# Altium integrated library CONNECTORS - PIN HEADERS.IntLib: 94 symbols (part 1 of 2)
Pins are listed as number, name and electrical type; pins without a type are passive.

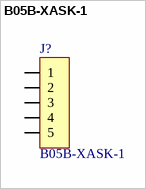
[diagram p0: symbol B05B-XASK-1]

## B05B-XASK-1
designator J?
XA series header, shrouded, Polarizing boss, 2.5mm pitch, 5 pin; Manufacturer: JST (Japan Solderless Terminals); Mates with: XAP-05V-1; Rows: 1; Orientation: Vertical; Pins: 5; Pitch: 2.5mm; PackageDescription: XA Series, 5 pin vertical header with shroud and locking ramp; Part Number: B05B-XASK-1
footprint XA-HDR-5PIN-VERT (XA Series, 5 pin vertical header with shroud and locking ramp)
3D model B05B-XASK-1 (PCB3D Model)
pins: 1, 2, 3, 4, 5


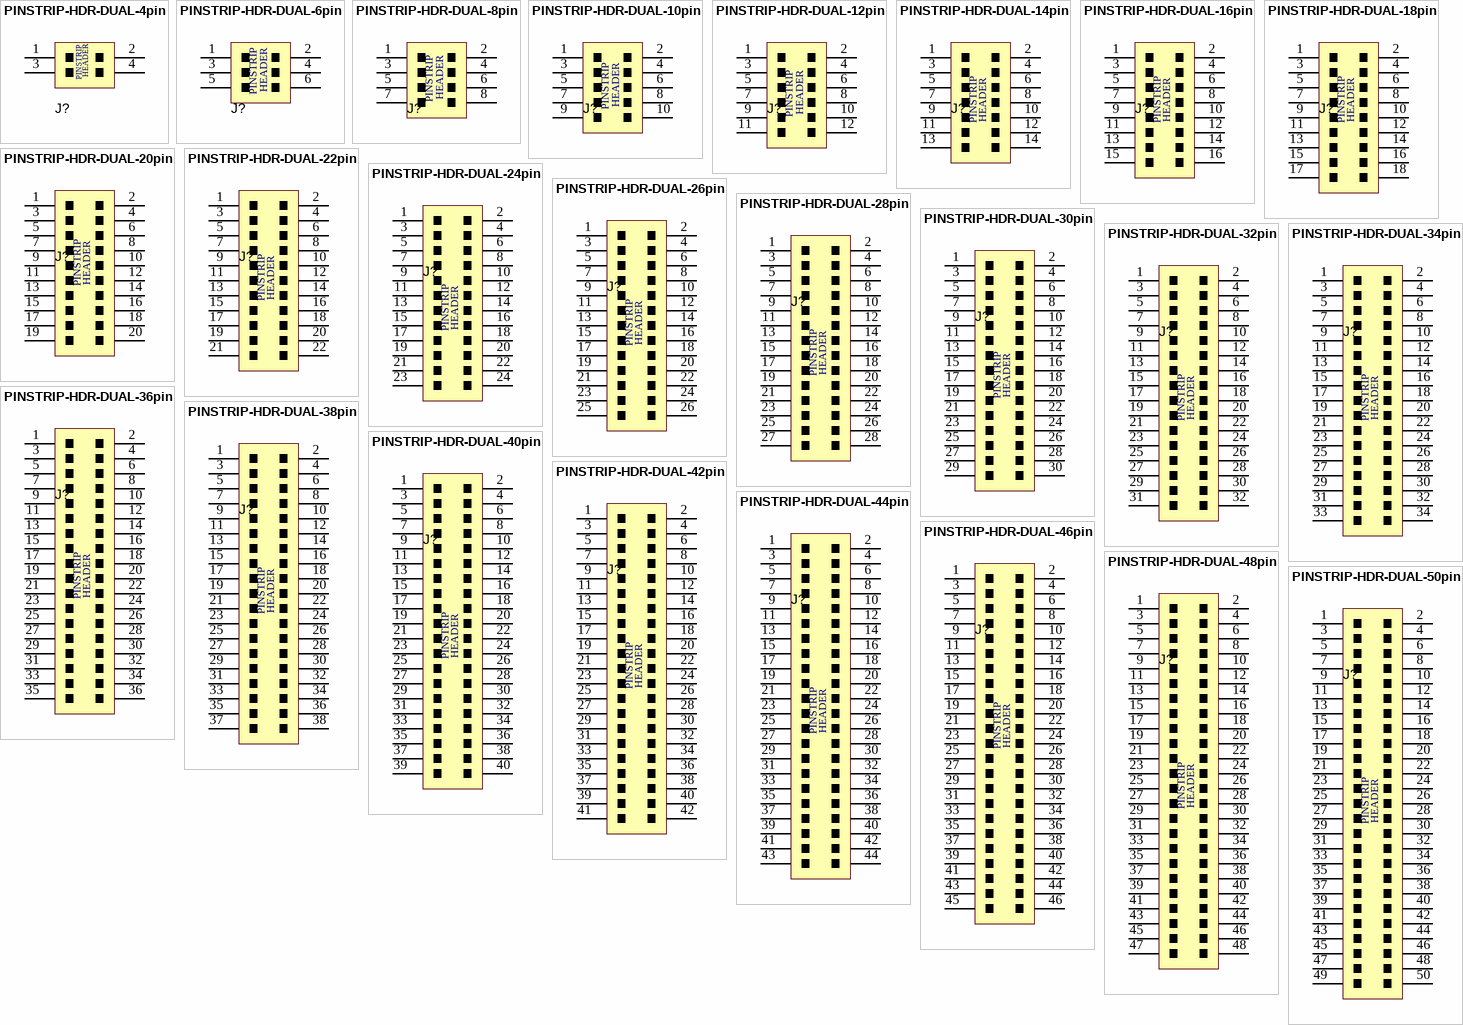
[diagram p1: symbols PINSTRIP-HDR-DUAL-4pin to PINSTRIP-HDR-DUAL-50pin]

## PINSTRIP-HDR-DUAL-4pin
designator J?, comment 9-146261-0  (value not drawn)
4 Pin Header, Pin Strip, , Dual row, 2.54mm pitch, Unshrouded, Pin Strip, Vertical; Manufacturer: TE Connectivity; Part Number: 4/80 of 9-146261-0; Pitch: 0.100" (2.54mm); Rows: 2; Mates With (PCB): 5-534206-2; Mates With (Wire housing): 022-55-2041 (MOLEX, uses crimp series 70058, 70028); Connector Height: 320 mil; Mounting Type: Through Hole; PackageDescription: Pin header; 2.54mm pitch; Pins: 4; Supplier 1: Mouser; Supplier Part Number 1: 571-41037830; Supplier 2: Digi-Key; Supplier Part Number 2: A34268-40-ND; Supplier 3: Mouser; Supplier Part Number 3: 571-9-146261-0
footprint PINSTRIP-DUAL-4PIN-.1 (2.54mm (0.100") pitch, Through Hole, Dual Row, Vertical, 4 pin)
3D model Pinstrip-100mil-DUAL_HDR-4pin (PCB3D Model)
pins: 1, 2, 3, 4
text: PINSTRIP; HEADER

## PINSTRIP-HDR-DUAL-6pin
designator J?, comment 9-146261-0  (value not drawn)
6 Pin Header, Pin Strip, , Dual row, 2.54mm pitch, Unshrouded Pin Strip, Vertical; Manufacturer: TE Connectivity; Part Number: 6/80 of 9-146261-0; Pitch: 0.100" (2.54mm); Rows: 2; Mates With (PCB): 5-534206-3; Mates With (Wire housing): 022-55-2061 (MOLEX, uses crimp series 70058, 70028); Connector Height: 320 mil; Mounting Type: Through Hole; PackageDescription: Pin header; 2.54mm pitch; Pins: 6; Supplier 1: Mouser; Supplier 2: Digi-Key; Supplier 3: Mouser; Supplier Part Number 1: 571-41037830; Supplier Part Number 2: A34268-40-ND; Supplier Part Number 3: 571-9-146261-0
footprint PINSTRIP-DUAL-6PIN-.1 (2.54mm (0.100") Pitch Through Hole, Dual Row, Vertical, 6 pin)
3D model Pinstrip-100mil-DUAL_HDR-6pin (PCB3D Model)
pins: 1, 2, 3, 4, 5, 6
text: PINSTRIP; HEADER

## PINSTRIP-HDR-DUAL-8pin
designator J?, comment 9-146261-0  (value not drawn)
8 Pin Header, Pin Strip, , Dual row, 2.54mm pitch, Unshrouded Pin Strip, Vertical; Manufacturer: TE Connectivity; Part Number: 8/80 of 9-146261-0; Pitch: 0.100" (2.54mm); Rows: 2; Mates With (PCB): 5-534206-4; Mates With (Wire housing): 022-55-2081 (MOLEX, uses crimp series 70058, 70028); Connector Height: 320 mil; Mounting Type: Through Hole; PackageDescription: Pin header; 2.54mm pitch; Pins: 8; Supplier 1: Mouser; Supplier 2: Digi-Key; Supplier 3: Mouser; Supplier Part Number 1: 571-41037830; Supplier Part Number 2: A34268-40-ND; Supplier Part Number 3: 571-9-146261-0
footprint PINSTRIP-DUAL-8PIN-.1 (2.54mm (0.100") Pitch, Through Hole, Dual Row, Vertical, 8 pin)
3D model Pinstrip-100mil-DUAL_HDR-8pin (PCB3D Model)
pins: 1, 2, 3, 4, 5, 6, 7, 8
text: PINSTRIP; HEADER

## PINSTRIP-HDR-DUAL-10pin
designator J?, comment 9-146261-0  (value not drawn)
10 Pin Header, Pin Strip, , Dual row, 2.54mm pitch, Unshrouded Pin Strip, Vertical; Manufacturer: TE Connectivity; Part Number: 10/80 of 9-146261-0; Pitch: 0.100" (2.54mm); Rows: 2; Mates With (PCB): 5-534206-5; Mates With (Wire housing): 022-55-2101 (MOLEX, uses crimp series 70058, 70028); Connector Height: 320 mil; Mounting Type: Through Hole; PackageDescription: Pin header; 2.54mm pitch; Pins: 10; Supplier 1: Mouser; Supplier 2: Digi-Key; Supplier 3: Mouser; Supplier Part Number 1: 571-41037830; Supplier Part Number 2: A34268-40-ND; Supplier Part Number 3: 571-9-146261-0
footprint PINSTRIP-DUAL-10PIN-.1 (2.54mm (0.100") Pitch, Through Hole, Dual Row, Vertical, 10 pin)
3D model Pinstrip-100mil-DUAL_HDR-10pin (PCB3D Model)
pins: 1, 2, 3, 4, 5, 6, 7, 8, 9, 10
text: PINSTRIP; HEADER

## PINSTRIP-HDR-DUAL-12pin
designator J?, comment 9-146261-0  (value not drawn)
12 Pin Header, Pin Strip, , Dual row, 2.54mm pitch, Unshrouded Pin Strip, Vertical; Manufacturer: TE Connectivity; Part Number: 12/80 of 9-146261-0; Pitch: 0.100" (2.54mm); Rows: 2; Mates With (PCB): 5-534206-6; Mates With (Wire housing): 022-55-2121 (MOLEX, uses crimp series 70058, 70028); Connector Height: 320 mil; Mounting Type: Through Hole; PackageDescription: Pin header; 2.54mm pitch; Pins: 12; Supplier 1: Mouser; Supplier 2: Digi-Key; Supplier 3: Mouser; Supplier Part Number 1: 571-41037830; Supplier Part Number 2: A34268-40-ND; Supplier Part Number 3: 571-9-146261-0
footprint PINSTRIP-DUAL-12PIN-.1 (2.54mm (0.100") Pitch, Through Hole, Dual Row, Vertical, 12 pin)
3D model Pinstrip-100mil-DUAL_HDR-12pin (PCB3D Model)
pins: 1, 2, 3, 4, 5, 6, 7, 8, 9, 10, 11, 12
text: PINSTRIP; HEADER

## PINSTRIP-HDR-DUAL-14pin
designator J?, comment 9-146261-0  (value not drawn)
14 Pin Header, Pin Strip, , Dual row, 2.54mm pitch, Unshrouded Pin Strip, Vertical; Manufacturer: TE Connectivity; Part Number: 14/80 of 9-146261-0; Pitch: 0.100" (2.54mm); Rows: 2; Mates With (PCB): 5-534206-7; Mates With (Wire housing): 022-55-2141 (MOLEX, uses crimp series 70058, 70028); Connector Height: 320 mil; Mounting Type: Through Hole; PackageDescription: Pin header; 2.54mm pitch; Pins: 14; Supplier 1: Mouser; Supplier 2: Digi-Key; Supplier 3: Mouser; Supplier Part Number 1: 571-41037830; Supplier Part Number 2: A34268-40-ND; Supplier Part Number 3: 571-9-146261-0
footprint PINSTRIP-DUAL-14PIN-.1 (2.54mm (0.100") Pitch, Through Hole, Dual Row, Vertical, 14 pin)
3D model Pinstrip-100mil-DUAL_HDR-14pin (PCB3D Model)
pins: 1, 2, 3, 4, 5, 6, 7, 8, 9, 10, 11, 12, 13, 14
text: PINSTRIP; HEADER

## PINSTRIP-HDR-DUAL-16pin
designator J?, comment 9-146261-0  (value not drawn)
16 Pin Header, Pin Strip, , Dual row, 2.54mm pitch, Unshrouded Pin Strip, Vertical; Manufacturer: TE Connectivity; Part Number: 16/80 of 9-146261-0; Pitch: 0.100" (2.54mm); Rows: 2; Mates With (PCB): 5-534206-8; Mates With (Wire housing): 022-55-2161 (MOLEX, uses crimp series 70058, 70028); Connector Height: 320 mil; Mounting Type: Through Hole; PackageDescription: Pin header; 2.54mm pitch; Pins: 16; Supplier 1: Mouser; Supplier 2: Digi-Key; Supplier 3: Mouser; Supplier Part Number 1: 571-41037830; Supplier Part Number 2: A34268-40-ND; Supplier Part Number 3: 571-9-146261-0
footprint PINSTRIP-DUAL-16PIN-.1 (2.54mm (0.100") Pitch, Through Hole, Dual Row, Vertical, 16 pin)
3D model Pinstrip-100mil-DUAL_HDR-16pin (PCB3D Model)
pins: 1, 2, 3, 4, 5, 6, 7, 8, 9, 10, 11, 12, 13, 14, 15, 16
text: PINSTRIP; HEADER

## PINSTRIP-HDR-DUAL-18pin
designator J?, comment 9-146261-0  (value not drawn)
18 Pin Header, Pin Strip, , Dual row, 2.54mm pitch, Unshrouded Pin Strip, Vertical; Manufacturer: TE Connectivity; Part Number: 18/80 of 9-146261-0; Pitch: 0.100" (2.54mm); Rows: 2; Mates With (PCB): 5-534206-9; Mates With (Wire housing): 022-55-2181 (MOLEX, uses crimp series 70058, 70028); Connector Height: 320 mil; Mounting Type: Through Hole; PackageDescription: Pin header; 2.54mm pitch; Pins: 18; Supplier 1: Mouser; Supplier 2: Digi-Key; Supplier 3: Mouser; Supplier Part Number 1: 571-41037830; Supplier Part Number 2: A34268-40-ND; Supplier Part Number 3: 571-9-146261-0
footprint PINSTRIP-DUAL-18PIN-.1 (2.54mm (0.100") Pitch, Through Hole, Dual Row, Vertical, 18 pin)
3D model Pinstrip-100mil-DUAL_HDR-18pin (PCB3D Model)
pins: 1, 2, 3, 4, 5, 6, 7, 8, 9, 10, 11, 12, 13, 14, 15, 16, 17, 18
text: PINSTRIP; HEADER

## PINSTRIP-HDR-DUAL-20pin
designator J?, comment 9-146261-0  (value not drawn)
20 Pin Header, Pin Strip, , Dual row, 2.54mm pitch, Unshrouded Pin Strip, Vertical; Manufacturer: TE Connectivity; Part Number: 20/80 of 9-146261-0; Pitch: 0.100" (2.54mm); Rows: 2; Mates With (PCB): 6-534206-0; Mates With (Wire housing): 022-55-2201 (MOLEX, uses crimp series 70058, 70028); Connector Height: 320 mil; Mounting Type: Through Hole; PackageDescription: Pin header; 2.54mm pitch; Pins: 20; Supplier 1: Mouser; Supplier 2: Digi-Key; Supplier 3: Mouser; Supplier Part Number 1: 571-41037830; Supplier Part Number 2: A34268-40-ND; Supplier Part Number 3: 571-9-146261-0
footprint PINSTRIP-DUAL-20PIN-.1 (2.54mm (0.100") Pitch, Through Hole, Dual Row, Vertical, 20 pin)
3D model Pinstrip-100mil-DUAL_HDR-20pin (PCB3D Model)
pins: 1, 2, 3, 4, 5, 6, 7, 8, 9, 10, 11, 12, 13, 14, 15, 16, 17, 18, 19, 20
text: PINSTRIP; HEADER

## PINSTRIP-HDR-DUAL-22pin
designator J?, comment 9-146261-0  (value not drawn)
22 Pin Header, Pin Strip, , Dual row, 2.54mm pitch, Unshrouded Pin Strip, Vertical; Manufacturer: TE Connectivity; Part Number: 22/80 of 9-146261-0; Pitch: 0.100" (2.54mm); Rows: 2; Mates With (PCB): 6-534206-1; Mates With (Wire housing): 022-55-2221 (MOLEX, uses crimp series 70058, 70028); Connector Height: 320 mil; Mounting Type: Through Hole; PackageDescription: Pin header; 2.54mm pitch; Pins: 22; Supplier 1: Mouser; Supplier 2: Digi-Key; Supplier 3: Mouser; Supplier Part Number 1: 571-41037830; Supplier Part Number 2: A34268-40-ND; Supplier Part Number 3: 571-9-146261-0
footprint PINSTRIP-DUAL-22PIN-.1 (2.54mm (0.100") Pitch, Through Hole, Dual Row, Vertical, 22 pin)
3D model Pinstrip-100mil-DUAL_HDR-22pin (PCB3D Model)
pins: 1, 2, 3, 4, 5, 6, 7, 8, 9, 10, 11, 12, 13, 14, 15, 16, 17, 18, 19, 20, 21, 22
text: PINSTRIP; HEADER

## PINSTRIP-HDR-DUAL-24pin
designator J?, comment 9-146261-0  (value not drawn)
24 Pin Header, Pin Strip, , Dual row, 2.54mm pitch, Unshrouded Pin Strip, Vertical; Manufacturer: TE Connectivity; Part Number: 24/80 of 9-146261-0; Pitch: 0.100" (2.54mm); Rows: 2; Mates With (PCB): 6-534206-2; Mates With (Wire housing): 022-55-2241 (MOLEX, uses crimp series 70058, 70028); Connector Height: 320 mil; Mounting Type: Through Hole; PackageDescription: Pin header; 2.54mm pitch; Pins: 24; Supplier 1: Mouser; Supplier 2: Digi-Key; Supplier 3: Mouser; Supplier Part Number 1: 571-41037830; Supplier Part Number 2: A34268-40-ND; Supplier Part Number 3: 571-9-146261-0
footprint PINSTRIP-DUAL-24PIN-.1 (2.54mm (0.100") Pitch, Through Hole, Dual Row, Vertical, 24 pin)
3D model Pinstrip-100mil-DUAL_HDR-24pin (PCB3D Model)
pins: 1, 2, 3, 4, 5, 6, 7, 8, 9, 10, 11, 12, 13, 14, 15, 16, 17, 18, 19, 20, 21, 22, 23, 24
text: PINSTRIP; HEADER

## PINSTRIP-HDR-DUAL-26pin
designator J?, comment 9-146261-0  (value not drawn)
26 Pin Header, Pin Strip, , Dual row, 2.54mm pitch, Unshrouded Pin Strip, Vertical; Manufacturer: TE Connectivity; Part Number: 26/80 of 9-146261-0; Pitch: 0.100" (2.54mm); Rows: 2; Mates With (PCB): 6-534206-3; Mates With (Wire housing): 022-55-2261 (MOLEX, uses crimp series 70058, 70028); Connector Height: 320 mil; Mounting Type: Through Hole; PackageDescription: Pin header; 2.54mm pitch; Pins: 26; Supplier 1: Mouser; Supplier 2: Digi-Key; Supplier 3: Mouser; Supplier Part Number 1: 571-41037830; Supplier Part Number 2: A34268-40-ND; Supplier Part Number 3: 571-9-146261-0
footprint PINSTRIP-DUAL-26PIN-.1 (2.54mm (0.100") Pitch, Through Hole, Dual Row, Vertical, 26 pin)
3D model Pinstrip-100mil-DUAL_HDR-26pin (PCB3D Model)
pins: 1, 2, 3, 4, 5, 6, 7, 8, 9, 10, 11, 12, 13, 14, 15, 16, 17, 18, 19, 20, 21, 22, 23, 24, 25, 26
text: PINSTRIP; HEADER

## PINSTRIP-HDR-DUAL-28pin
designator J?, comment 9-146261-0  (value not drawn)
28 Pin Header, Pin Strip, , Dual row, 2.54mm pitch, Unshrouded Pin Strip, Vertical; Manufacturer: TE Connectivity; Part Number: 28/80 of 9-146261-0; Pitch: 0.100" (2.54mm); Rows: 2; Mates With (PCB): 6-534206-4; Mates With (Wire housing): 022-55-2281 (MOLEX, uses crimp series 70058, 70028); Connector Height: 320 mil; Mounting Type: Through Hole; PackageDescription: Pin header; 2.54mm pitch; Pins: 28; Supplier 1: Mouser; Supplier 2: Digi-Key; Supplier 3: Mouser; Supplier Part Number 1: 571-41037830; Supplier Part Number 2: A34268-40-ND; Supplier Part Number 3: 571-9-146261-0
footprint PINSTRIP-DUAL-28PIN-.1 (2.54mm (0.100") Pitch, Through Hole, Dual Row, Vertical, 28 pin)
3D model Pinstrip-100mil-DUAL_HDR-28pin (PCB3D Model)
pins: 1, 2, 3, 4, 5, 6, 7, 8, 9, 10, 11, 12, 13, 14, 15, 16, 17, 18, 19, 20, 21, 22, 23, 24, 25, 26, 27, 28
text: PINSTRIP; HEADER

## PINSTRIP-HDR-DUAL-30pin
designator J?, comment 9-146261-0  (value not drawn)
30 Pin Header, Pin Strip, , Dual row, 2.54mm pitch, Unshrouded Pin Strip, Vertical; Manufacturer: TE Connectivity; Part Number: 30/80 of 9-146261-0; Pitch: 0.100" (2.54mm); Rows: 2; Mates With (PCB): 6-534206-5; Mates With (Wire housing): 022-55-2301 (MOLEX, uses crimp series 70058, 70028); Connector Height: 320 mil; Mounting Type: Through Hole; PackageDescription: Pin header; 2.54mm pitch; Pins: 30; Supplier 1: Mouser; Supplier 2: Digi-Key; Supplier 3: Mouser; Supplier Part Number 1: 571-41037830; Supplier Part Number 2: A34268-40-ND; Supplier Part Number 3: 571-9-146261-0
footprint PINSTRIP-DUAL-30PIN-.1 (2.54mm (0.100") Pitch, Through Hole, Dual Row, Vertical, 30 pin)
3D model Pinstrip-100mil-DUAL_HDR-30pin (PCB3D Model)
pins: 1, 2, 3, 4, 5, 6, 7, 8, 9, 10, 11, 12, 13, 14, 15, 16, 17, 18, 19, 20, 21, 22, 23, 24, 25, 26, 27, 28, 29, 30
text: PINSTRIP; HEADER

## PINSTRIP-HDR-DUAL-32pin
designator J?, comment 9-146261-0  (value not drawn)
32 Pin Header, Pin Strip, , Dual row, 2.54mm pitch, Unshrouded Pin Strip, Vertical; Manufacturer: TE Connectivity; Part Number: 32/80 of 9-146261-0; Pitch: 0.100" (2.54mm); Rows: 2; Mates With (PCB): 6-534206-6; Mates With (Wire housing): 022-55-2321 (MOLEX, uses crimp series 70058, 70028); Connector Height: 320 mil; Mounting Type: Through Hole; PackageDescription: Pin header; 2.54mm pitch; Pins: 32; Supplier 1: Mouser; Supplier 2: Digi-Key; Supplier 3: Mouser; Supplier Part Number 1: 571-41037830; Supplier Part Number 2: A34268-40-ND; Supplier Part Number 3: 571-9-146261-0
footprint PINSTRIP-DUAL-32PIN-.1 (2.54mm (0.100") Pitch, Through Hole, Dual Row, Vertical, 32 pin)
3D model Pinstrip-100mil-DUAL_HDR-32pin (PCB3D Model)
pins: 1, 2, 3, 4, 5, 6, 7, 8, 9, 10, 11, 12, 13, 14, 15, 16, 17, 18, 19, 20, 21, 22, 23, 24, 25, 26, 27, 28, 29, 30, 31, 32
text: PINSTRIP; HEADER

## PINSTRIP-HDR-DUAL-34pin
designator J?, comment 9-146261-0  (value not drawn)
34 Pin Header, Pin Strip, , Dual row, 2.54mm pitch, Unshrouded Pin Strip, Vertical; Manufacturer: TE Connectivity; Part Number: 34/80 of 9-146261-0; Pitch: 0.100" (2.54mm); Rows: 2; Mates With (PCB): 6-534206-7; Mates With (Wire housing): 022-55-2341 (MOLEX, uses crimp series 70058, 70028); Connector Height: 320 mil; Mounting Type: Through Hole; PackageDescription: Pin header; 2.54mm pitch; Pins: 34; Supplier 1: Mouser; Supplier 2: Digi-Key; Supplier 3: Mouser; Supplier Part Number 1: 571-41037830; Supplier Part Number 2: A34268-40-ND; Supplier Part Number 3: 571-9-146261-0
footprint PINSTRIP-DUAL-34PIN-.1 (2.54mm (0.100") Pitch, Through Hole, Dual Row, Vertical, 34 pin)
3D model Pinstrip-100mil-DUAL_HDR-34pin (PCB3D Model)
pins: 1, 2, 3, 4, 5, 6, 7, 8, 9, 10, 11, 12, 13, 14, 15, 16, 17, 18, 19, 20, 21, 22, 23, 24, 25, 26, 27, 28, 29, 30, 31, 32, 33, 34
text: PINSTRIP; HEADER

## PINSTRIP-HDR-DUAL-36pin
designator J?, comment 9-146261-0  (value not drawn)
36 Pin Header, Pin Strip, , Dual row, 2.54mm pitch, Unshrouded Pin Strip, Vertical; Manufacturer: TE Connectivity; Part Number: 36/80 of 9-146261-0; Pitch: 0.100" (2.54mm); Rows: 2; Mates With (PCB): 6-534206-8; Mates With (Wire housing): 022-55-2361 (MOLEX, uses crimp series 70058, 70028); Connector Height: 320 mil; Mounting Type: Through Hole; PackageDescription: Pin header; 2.54mm pitch; Pins: 36; Supplier 1: Mouser; Supplier 2: Digi-Key; Supplier 3: Mouser; Supplier Part Number 1: 571-41037830; Supplier Part Number 2: A34268-40-ND; Supplier Part Number 3: 571-9-146261-0
footprint PINSTRIP-DUAL-36PIN-.1 (2.54mm (0.100") Pitch, Through Hole, Dual Row, Vertical, 36 pin)
3D model Pinstrip-100mil-DUAL_HDR-36pin (PCB3D Model)
pins: 1, 2, 3, 4, 5, 6, 7, 8, 9, 10, 11, 12, 13, 14, 15, 16, 17, 18, 19, 20, 21, 22, 23, 24, 25, 26, 27, 28, 29, 30, 31, 32, 33, 34, 35, 36
text: PINSTRIP; HEADER

## PINSTRIP-HDR-DUAL-38pin
designator J?, comment 9-146261-0  (value not drawn)
38 Pin Header, Pin Strip, , Dual row, 2.54mm pitch, Unshrouded Pin Strip, Vertical; Manufacturer: TE Connectivity; Part Number: 38/80 of 9-146261-0; Pitch: 0.100" (2.54mm); Rows: 2; Mates With (PCB): 6-534206-9; Mates With (Wire housing): 022-55-2381 (MOLEX, uses crimp series 70058, 70028); Connector Height: 320 mil; Mounting Type: Through Hole; PackageDescription: Pin header; 2.54mm pitch; Pins: 38; Supplier 1: Mouser; Supplier 2: Digi-Key; Supplier 3: Mouser; Supplier Part Number 1: 571-41037830; Supplier Part Number 2: A34268-40-ND; Supplier Part Number 3: 571-9-146261-0
footprint PINSTRIP-DUAL-38PIN-.1 (2.54mm (0.100") Pitch, Through Hole, Dual Row, Vertical, 38 pin)
3D model Pinstrip-100mil-DUAL_HDR-38pin (PCB3D Model)
pins: 1, 2, 3, 4, 5, 6, 7, 8, 9, 10, 11, 12, 13, 14, 15, 16, 17, 18, 19, 20, 21, 22, 23, 24, 25, 26, 27, 28, 29, 30, 31, 32, 33, 34, 35, 36, 37, 38
text: PINSTRIP; HEADER

## PINSTRIP-HDR-DUAL-40pin
designator J?, comment 9-146261-0  (value not drawn)
40 Pin Header, Pin Strip, , Dual row, 2.54mm pitch, Unshrouded Pin Strip, Vertical; Manufacturer: TE Connectivity; Part Number: 40/80 of 9-146261-0; Pitch: 0.100" (2.54mm); Rows: 2; Mates With (PCB): 7-534206-0; Mates With (Wire housing): 022-55-2401 (MOLEX, uses crimp series 70058, 70028); Connector Height: 320 mil; Mounting Type: Through Hole; PackageDescription: Pin header; 2.54mm pitch; Pins: 40; Supplier 1: Mouser; Supplier 2: Digi-Key; Supplier 3: Mouser; Supplier Part Number 1: 571-41037830; Supplier Part Number 2: A34268-40-ND; Supplier Part Number 3: 571-9-146261-0
footprint PINSTRIP-DUAL-40PIN-.1 (2.54mm (0.100") Pitch, Through Hole, Dual Row, Vertical, 40 pin)
3D model Pinstrip-100mil-DUAL_HDR-40pin (PCB3D Model)
pins: 1, 2, 3, 4, 5, 6, 7, 8, 9, 10, 11, 12, 13, 14, 15, 16, 17, 18, 19, 20, 21, 22, 23, 24, 25, 26, 27, 28, 29, 30, 31, 32, 33, 34, 35, 36, 37, 38, 39, 40
text: PINSTRIP; HEADER

## PINSTRIP-HDR-DUAL-42pin
designator J?, comment 9-146261-0  (value not drawn)
42 Pin Header, Pin Strip, , Dual row, 2.54mm pitch, Unshrouded Pin Strip, Vertical; Manufacturer: TE Connectivity; Part Number: 42/80 of 9-146261-0; Pitch: 0.100" (2.54mm); Rows: 2; Mates With (PCB): 7-534206-1; Mates With (Wire housing): 022-55-2421 (MOLEX, uses crimp series 70058, 70028); Connector Height: 320 mil; Mounting Type: Through Hole; PackageDescription: Pin header; 2.54mm pitch; Pins: 42; Supplier 1: Mouser; Supplier 2: Digi-Key; Supplier 3: Mouser; Supplier Part Number 1: 571-41037830; Supplier Part Number 2: A34268-40-ND; Supplier Part Number 3: 571-9-146261-0
footprint PINSTRIP-DUAL-42PIN-.1 (2.54mm (0.100") Pitch, Through Hole, Dual Row, Vertical, 42 pin)
3D model Pinstrip-100mil-DUAL_HDR-42pin (PCB3D Model)
pins: 1, 2, 3, 4, 5, 6, 7, 8, 9, 10, 11, 12, 13, 14, 15, 16, 17, 18, 19, 20, 21, 22, 23, 24, 25, 26, 27, 28, 29, 30, 31, 32, 33, 34, 35, 36, 37, 38, 39, 40, 41, 42
text: PINSTRIP; HEADER

## PINSTRIP-HDR-DUAL-44pin
designator J?, comment 9-146261-0  (value not drawn)
44 Pin Header, Pin Strip, , Dual row, 2.54mm pitch, Unshrouded Pin Strip, Vertical; Manufacturer: TE Connectivity; Part Number: 44/80 of 9-146261-0; Pitch: 0.100" (2.54mm); Rows: 2; Mates With (PCB): 7-534206-2; Mates With (Wire housing): 022-55-2441 (MOLEX, uses crimp series 70058, 70028); Connector Height: 320 mil; Mounting Type: Through Hole; PackageDescription: Pin header; 2.54mm pitch; Pins: 44; Supplier 1: Mouser; Supplier 2: Digi-Key; Supplier 3: Mouser; Supplier Part Number 1: 571-41037830; Supplier Part Number 2: A34268-40-ND; Supplier Part Number 3: 571-9-146261-0
footprint PINSTRIP-DUAL-44PIN-.1 (2.54mm (0.100") Pitch, Through Hole, Dual Row, Vertical, 44 pin)
3D model Pinstrip-100mil-DUAL_HDR-44pin (PCB3D Model)
pins: 1, 2, 3, 4, 5, 6, 7, 8, 9, 10, 11, 12, 13, 14, 15, 16, 17, 18, 19, 20, 21, 22, 23, 24, 25, 26, 27, 28, 29, 30, 31, 32, 33, 34, 35, 36, 37, 38, 39, 40, 41, 42, 43, 44
text: PINSTRIP; HEADER

## PINSTRIP-HDR-DUAL-46pin
designator J?, comment 9-146261-0  (value not drawn)
46 Pin Header, Pin Strip, , Dual row, 2.54mm pitch, Unshrouded Pin Strip, Vertical; Manufacturer: TE Connectivity; Part Number: 46/80 of 9-146261-0; Pitch: 0.100" (2.54mm); Rows: 2; Mates With (PCB): 7-534206-3; Mates With (Wire housing): 022-55-2461 (MOLEX, uses crimp series 70058, 70028); Connector Height: 320 mil; Mounting Type: Through Hole; PackageDescription: Pin header; 2.54mm pitch; Pins: 46; Supplier 1: Mouser; Supplier 2: Digi-Key; Supplier 3: Mouser; Supplier Part Number 1: 571-41037830; Supplier Part Number 2: A34268-40-ND; Supplier Part Number 3: 571-9-146261-0
footprint PINSTRIP-DUAL-46PIN-.1 (2.54mm (0.100") Pitch, Through Hole, Dual Row, Vertical, 49 pin)
3D model Pinstrip-100mil-DUAL_HDR-46pin (PCB3D Model)
pins: 1, 2, 3, 4, 5, 6, 7, 8, 9, 10, 11, 12, 13, 14, 15, 16, 17, 18, 19, 20, 21, 22, 23, 24, 25, 26, 27, 28, 29, 30, 31, 32, 33, 34, 35, 36, 37, 38, 39, 40, 41, 42, 43, 44, 45, 46
text: PINSTRIP; HEADER

## PINSTRIP-HDR-DUAL-48pin
designator J?, comment 9-146261-0  (value not drawn)
48 Pin Header, Pin Strip, , Dual row, 2.54mm pitch, Unshrouded Pin Strip, Vertical; Manufacturer: TE Connectivity; Part Number: 48/80 of 9-146261-0; Pitch: 0.100" (2.54mm); Rows: 2; Mates With (PCB): 7-534206-4; Mates With (Wire housing): 022-55-2481 (MOLEX, uses crimp series 70058, 70028); Connector Height: 320 mil; Mounting Type: Through Hole; PackageDescription: Pin header; 2.54mm pitch; Pins: 48; Supplier 1: Mouser; Supplier 2: Digi-Key; Supplier 3: Mouser; Supplier Part Number 1: 571-41037830; Supplier Part Number 2: A34268-40-ND; Supplier Part Number 3: 571-9-146261-0
footprint PINSTRIP-DUAL-48PIN-.1 (2.54mm (0.100") Pitch, Through Hole, Dual Row, Vertical, 48 pin)
3D model Pinstrip-100mil-DUAL_HDR-48pin (PCB3D Model)
pins: 1, 2, 3, 4, 5, 6, 7, 8, 9, 10, 11, 12, 13, 14, 15, 16, 17, 18, 19, 20, 21, 22, 23, 24, 25, 26, 27, 28, 29, 30, 31, 32, 33, 34, 35, 36, 37, 38, 39, 40, 41, 42, 43, 44, 45, 46, 47, 48
text: PINSTRIP; HEADER

## PINSTRIP-HDR-DUAL-50pin
designator J?, comment 9-146261-0  (value not drawn)
50 Pin Header, Pin Strip, , Dual row, 2.54mm pitch, Unshrouded Pin Strip, Vertical; Manufacturer: TE Connectivity; Part Number: 50/80 of 9-146261-0; Pitch: 0.100" (2.54mm); Rows: 2; Mates With (PCB): 7-534206-5; Mates With (Wire housing): 022-55-2501 (MOLEX, uses crimp series 70058, 70028); Connector Height: 320 mil; Mounting Type: Through Hole; PackageDescription: Pin header; 2.54mm pitch; Pins: 50; Supplier 1: Mouser; Supplier 2: Digi-Key; Supplier 3: Mouser; Supplier Part Number 1: 571-41037830; Supplier Part Number 2: A34268-40-ND; Supplier Part Number 3: 571-9-146261-0
footprint PINSTRIP-DUAL-50PIN-.1 (2.54mm (0.100") Pitch, Through Hole, Dual Row, Vertical, 50 pin)
3D model Pinstrip-100mil-DUAL_HDR-50pin (PCB3D Model)
pins: 1, 2, 3, 4, 5, 6, 7, 8, 9, 10, 11, 12, 13, 14, 15, 16, 17, 18, 19, 20, 21, 22, 23, 24, 25, 26, 27, 28, 29, 30, 31, 32, 33, 34, 35, 36, 37, 38, 39, 40, 41, 42, 43, 44, 45, 46, 47, 48, 49, 50
text: PINSTRIP; HEADER

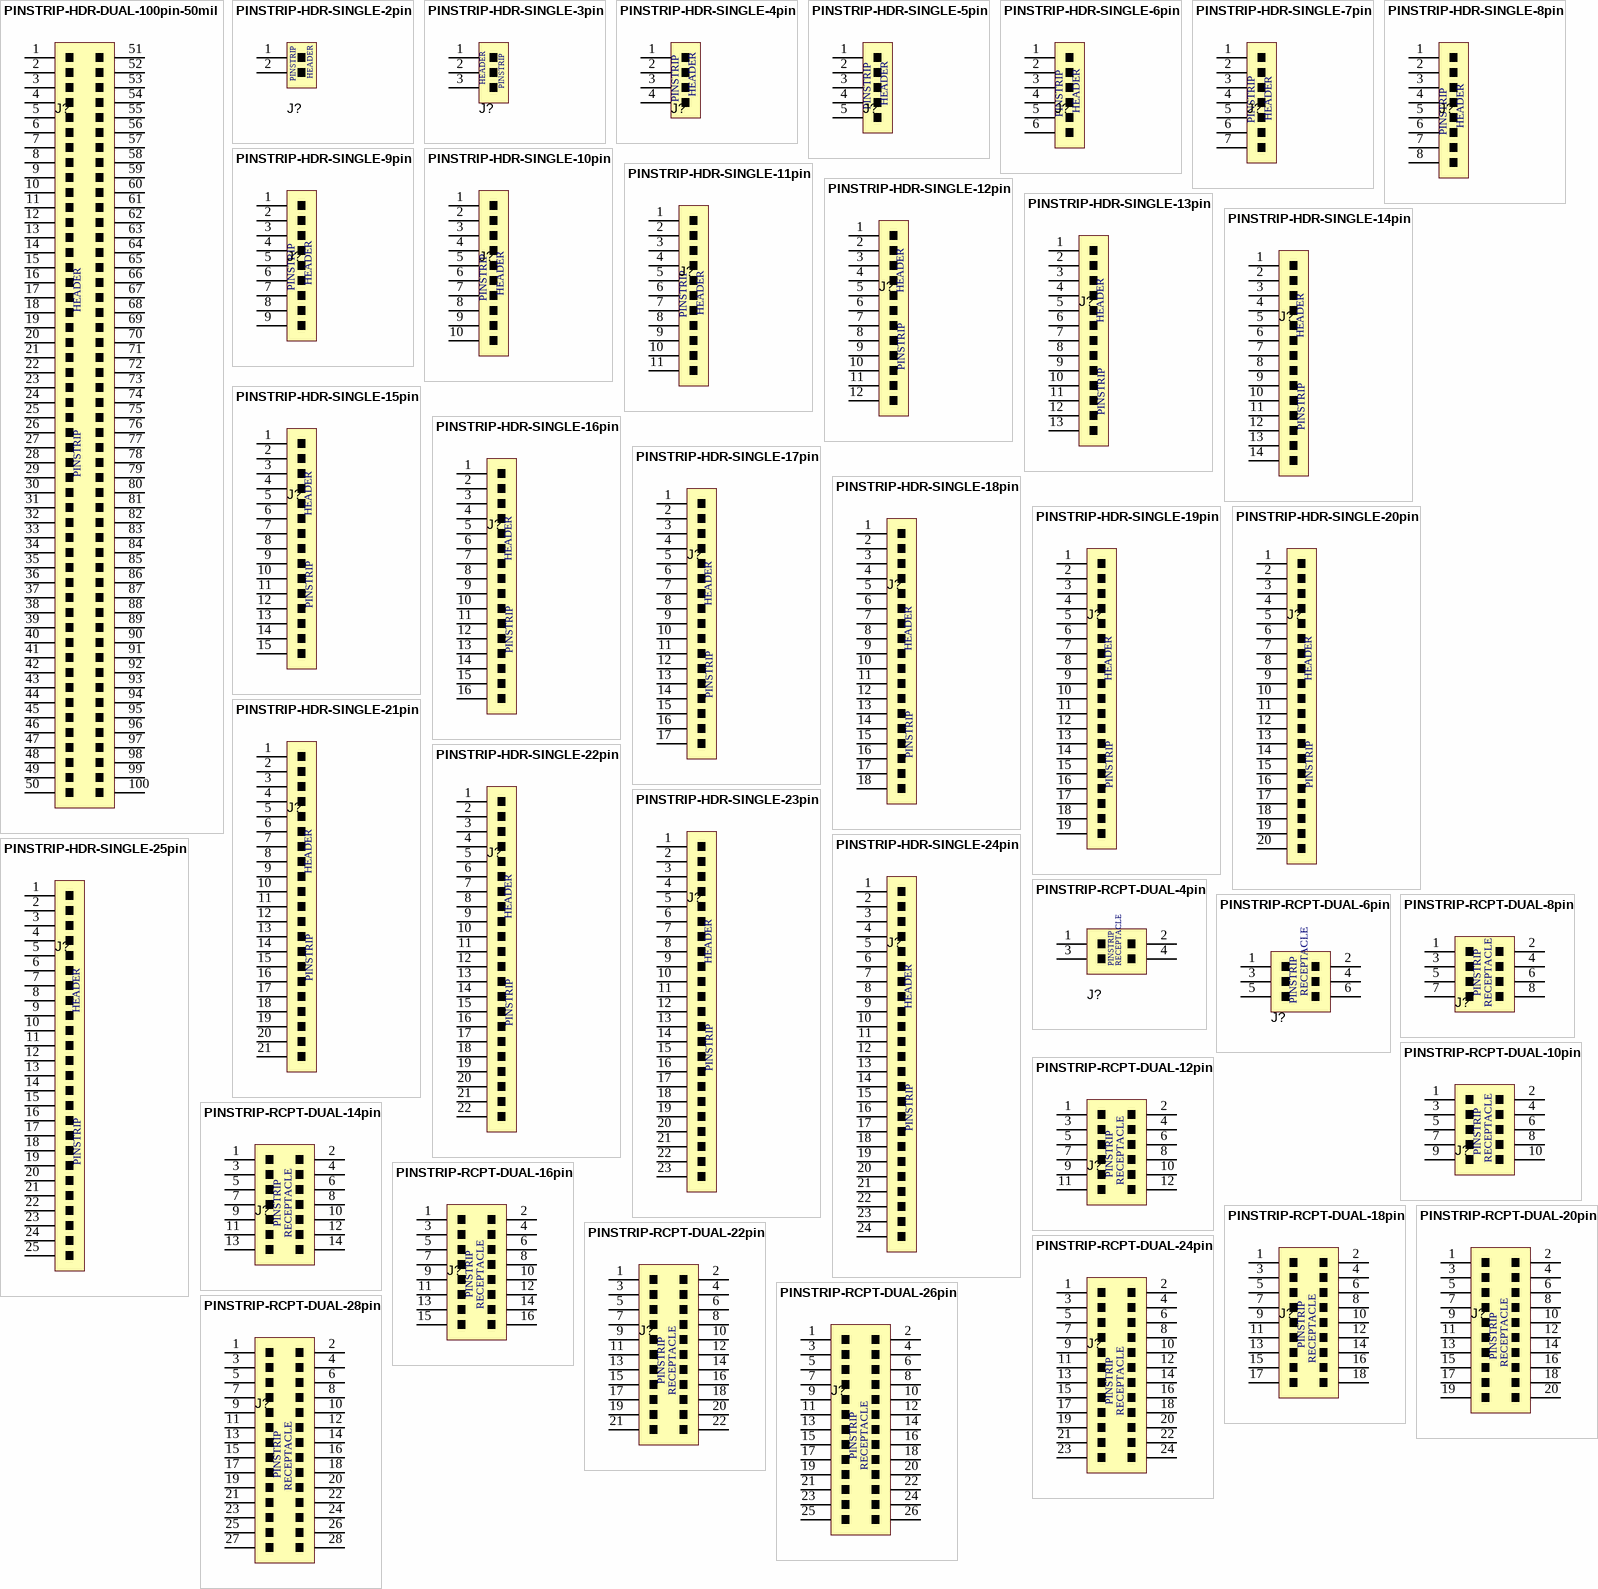
[diagram p2: symbols PINSTRIP-HDR-DUAL-100pin-50mil to PINSTRIP-RCPT-DUAL-28pin]

## PINSTRIP-HDR-DUAL-100pin-50mil
designator J?, comment HDWM-50-54-G-D-250-SM  (value not drawn)
100 Pin Header, Pin Strip, Board Spacer (435mil) , Dual row, 1.27mm pitch, Unshrouded Pin Strip, Vertical; Manufacturer: Samtec; Pitch: 0.050" (1.27mm); Rows: 2; Mates With (PCB): SLM-150-01-G-D, SMS-150-01-G-D; Connector Height: 555 mil; Mounting Type: Through Hole; PackageDescription: Pin header; 1.27mm pitch; Part Number: HDWM-50-54-G-D-250-SM; Package Reference: 50X2_PINSTRIP_HEADER_0.05X0.1; Pins: 100; Mates With (Wire housing): N/A
footprint 50X2_PINSTRIP_HEADER_0.05X0.1 (1.57mm (0.500") pitch, Surface Mount, Dual Row, Vertical, 100 pin)
3D model Samtec-HDWM-50-54-G-D-250-SM (PCB3D Model)
pins: 1, 2, 3, 4, 5, 6, 7, 8, 9, 10, 11, 12, 13, 14, 15, 16, 17, 18, 19, 20, 21, 22, 23, 24, 25, 26, 27, 28, 29, 30, 31, 32, 33, 34, 35, 36, 37, 38, 39, 40, 41, 42, 43, 44, 45, 46, 47, 48, 49, 50, 51, 52, 53, 54, 55, 56, 57, 58, 59, 60, 61, 62, 63, 64, 65, 66, 67, 68, 69, 70, 71, 72, 73, 74, 75, 76, 77, 78, 79, 80, 81, 82, 83, 84, 85, 86, 87, 88, 89, 90, 91, 92, 93, 94, 95, 96, 97, 98, 99, 100
text: HEADER; PINSTRIP

## PINSTRIP-HDR-SINGLE-2pin
designator J?, comment 9-146285-0  (value not drawn)
2 Pin Header, Single row, 2.54mm pitch, Unshrouded Pin Strip, Vertical; Manufacturer: TE Connectivity; Part Number: 02/40 of 9-146285-0; Pitch: 0.100" (2.54mm); Rows: 1; Mates With (PCB): 5-534206-1; Mates With (Wire housing): 50-57-9002 (MOLEX Part, Uses crimp terminal series 70058, 71851, 70021); Connector Height: 320 mil; Mounting Type: Through Hole; PackageDescription: Pin header; 2.54mm pitch; Pins: 2; Supplier 1: Digi-Key; Supplier Part Number 1: A32700-40-ND; Supplier 2: Newark; Supplier Part Number 2: 16M3463; Supplier 3: Mouser; Supplier Part Number 3: 571-9-146285-0
footprint PINSTRIP-SINGLE-2PIN-.1 (2.54mm (0.100") Pitch, Through Hole, Single Row, Vertical, 2 pin)
3D model Pinstrip-100mil-SINGLE_HDR-2pin (PCB3D Model)
pins: 1, 2
text: PINSTRIP; HEADER

## PINSTRIP-HDR-SINGLE-3pin
designator J?, comment 9-146285-0  (value not drawn)
3 Pin Header, Single row, 2.54mm pitch, Unshrouded Pin Strip, Vertical; Manufacturer: TE Connectivity; Part Number: 03/40 of 9-146285-0; Pitch: 0.100" (2.54mm); Rows: 1; Mates With (PCB): 5-534237-1; Mates With (Wire housing): 50-57-9003 (MOLEX Part, Uses crimp terminal series 70058, 71851, 70021); Connector Height: 320 mil; Mounting Type: Through Hole; PackageDescription: Pin header; 2.54mm pitch; Pins: 3; Supplier 1: Digi-Key; Supplier 2: Newark; Supplier 3: Mouser; Supplier Part Number 1: A32700-40-ND; Supplier Part Number 2: 16M3463; Supplier Part Number 3: 571-9-146285-0
footprint PINSTRIP-SINGLE-3PIN-.1 (2.54mm (0.100") Pitch, Through Hole, Single Row, Vertical, 3 pin)
3D model Pinstrip-100mil-SINGLE_HDR-3pin (PCB3D Model)
pins: 1, 2, 3
text: HEADER; PINSTRIP

## PINSTRIP-HDR-SINGLE-4pin
designator J?, comment 9-146285-0  (value not drawn)
4 Pin Header, Single row, 2.54mm pitch, Unshrouded Pin Strip, Vertical; Manufacturer: TE Connectivity; Part Number: 04/40 of 9-146285-0; Pitch: 0.100" (2.54mm); Rows: 1; Mates With (PCB): 5-534237-2; Mates With (Wire housing): 50-57-9004 (MOLEX Part, Uses crimp terminal series 70058, 71851, 70021); Connector Height: 320 mil; Mounting Type: Through Hole; PackageDescription: Pin header; 2.54mm pitch; Pins: 4; Supplier 1: Digi-Key; Supplier 2: Newark; Supplier 3: Mouser; Supplier Part Number 1: A32700-40-ND; Supplier Part Number 2: 16M3463; Supplier Part Number 3: 571-9-146285-0
footprint PINSTRIP-SINGLE-4PIN-.1 (2.54mm (0.100") Pitch, Through Hole, Single Row, Vertical, 4 pin)
3D model Pinstrip-100mil-SINGLE_HDR-4pin (PCB3D Model)
pins: 1, 2, 3, 4
text: HEADER; PINSTRIP

## PINSTRIP-HDR-SINGLE-5pin
designator J?, comment 9-146285-0  (value not drawn)
5 Pin Header, Single row, 2.54mm pitch, Unshrouded Pin Strip, Vertical; Manufacturer: TE Connectivity; Part Number: 05/40 of 9-146285-0; Pitch: 0.100" (2.54mm); Rows: 1; Mates With (PCB): 5-534237-3; Mates With (Wire housing): 50-57-9005 (MOLEX Part, Uses crimp terminal series 70058, 71851, 70021); Connector Height: 320 mil; Mounting Type: Through Hole; PackageDescription: Pin header; 2.54mm pitch; Pins: 5; Supplier 1: Digi-Key; Supplier 2: Newark; Supplier 3: Mouser; Supplier Part Number 1: A32700-40-ND; Supplier Part Number 2: 16M3463; Supplier Part Number 3: 571-9-146285-0
footprint PINSTRIP-SINGLE-5PIN-.1 (2.54mm (0.100") Pitch, Through Hole, Single Row, Vertical, 5 pin)
3D model Pinstrip-100mil-SINGLE_HDR-5pin (PCB3D Model)
pins: 1, 2, 3, 4, 5
text: HEADER; PINSTRIP

## PINSTRIP-HDR-SINGLE-6pin
designator J?, comment 9-146285-0  (value not drawn)
6 Pin Header, Single row, 2.54mm pitch, Unshrouded Pin Strip, Vertical; Manufacturer: TE Connectivity; Part Number: 06/40 of 9-146285-0; Pitch: 0.100" (2.54mm); Rows: 1; Mates With (PCB): 5-534237-4; Mates With (Wire housing): 50-57-9006 (MOLEX Part, Uses crimp terminal series 70058, 71851, 70021); Connector Height: 320 mil; Mounting Type: Through Hole; PackageDescription: Pin header; 2.54mm pitch; Pins: 6; Supplier 1: Digi-Key; Supplier 2: Newark; Supplier 3: Mouser; Supplier Part Number 1: A32700-40-ND; Supplier Part Number 2: 16M3463; Supplier Part Number 3: 571-9-146285-0
footprint PINSTRIP-SINGLE-6PIN-.1 (2.54mm (0.100") Pitch, Through Hole, Single Row, Vertical, 6 pin)
3D model Pinstrip-100mil-SINGLE_HDR-6pin (PCB3D Model)
pins: 1, 2, 3, 4, 5, 6
text: PINSTRIP; HEADER

## PINSTRIP-HDR-SINGLE-7pin
designator J?, comment 9-146285-0  (value not drawn)
7 Pin Header, Single row, 2.54mm pitch, Unshrouded Pin Strip, Vertical; Manufacturer: TE Connectivity; Part Number: 07/40 of 9-146285-0; Pitch: 0.100" (2.54mm); Rows: 1; Mates With (PCB): 5-534237-5; Mates With (Wire housing): 50-57-9007 (MOLEX Part, Uses crimp terminal series 70058, 71851, 70021); Connector Height: 320 mil; Mounting Type: Through Hole; PackageDescription: Pin header; 2.54mm pitch; Pins: 7; Supplier 1: Digi-Key; Supplier 2: Newark; Supplier 3: Mouser; Supplier Part Number 1: A32700-40-ND; Supplier Part Number 2: 16M3463; Supplier Part Number 3: 571-9-146285-0
footprint PINSTRIP-SINGLE-7PIN-.1 (2.54mm (0.100") Pitch, Through Hole, Single Row, Vertical, 7 pin)
3D model Pinstrip-100mil-SINGLE_HDR-7pin (PCB3D Model)
pins: 1, 2, 3, 4, 5, 6, 7
text: HEADER; PINSTRIP

## PINSTRIP-HDR-SINGLE-8pin
designator J?, comment 9-146285-0  (value not drawn)
8 Pin Header, Single row, 2.54mm pitch, Unshrouded Pin Strip, Vertical; Manufacturer: TE Connectivity; Part Number: 08/40 of 9-146285-0; Pitch: 0.100" (2.54mm); Rows: 1; Mates With (PCB): 5-534237-6; Mates With (Wire housing): 50-57-9008 (MOLEX Part, Uses crimp terminal series 70058, 71851, 70021); Connector Height: 320 mil; Mounting Type: Through Hole; PackageDescription: Pin header; 2.54mm pitch; Pins: 8; Supplier 1: Digi-Key; Supplier 2: Newark; Supplier 3: Mouser; Supplier Part Number 1: A32700-40-ND; Supplier Part Number 2: 16M3463; Supplier Part Number 3: 571-9-146285-0
footprint PINSTRIP-SINGLE-8PIN-.1 (2.54mm (0.100") Pitch, Through Hole, Single Row, Vertical, 8 pin)
3D model Pinstrip-100mil-SINGLE_HDR-8pin (PCB3D Model)
pins: 1, 2, 3, 4, 5, 6, 7, 8
text: PINSTRIP; HEADER

## PINSTRIP-HDR-SINGLE-9pin
designator J?, comment 9-146285-0  (value not drawn)
9 Pin Header, Single row, 2.54mm pitch, Unshrouded Pin Strip, Vertical; Manufacturer: TE Connectivity; Part Number: 09/40 of 9-146285-0; Pitch: 0.100" (2.54mm); Rows: 1; Mates With (PCB): 5-534237-7; Mates With (Wire housing): 50-57-9009 (MOLEX Part, Uses crimp terminal series 70058, 71851, 70021); Connector Height: 320 mil; Mounting Type: Through Hole; PackageDescription: Pin header; 2.54mm pitch; Pins: 9; Supplier 1: Digi-Key; Supplier 2: Newark; Supplier 3: Mouser; Supplier Part Number 1: A32700-40-ND; Supplier Part Number 2: 16M3463; Supplier Part Number 3: 571-9-146285-0
footprint PINSTRIP-SINGLE-9PIN-.1 (2.54mm (0.100") Pitch, Through Hole, Single Row, Vertical, 9 pin)
3D model Pinstrip-100mil-SINGLE_HDR-9pin (PCB3D Model)
pins: 1, 2, 3, 4, 5, 6, 7, 8, 9
text: PINSTRIP; HEADER

## PINSTRIP-HDR-SINGLE-10pin
designator J?, comment 9-146285-0  (value not drawn)
10 Pin Header, Single row, 2.54mm pitch, Unshrouded Pin Strip, Vertical; Manufacturer: TE Connectivity; Part Number: 10/40 of 9-146285-0; Pitch: 0.100" (2.54mm); Rows: 1; Mates With (PCB): 5-534237-8; Mates With (Wire housing): 50-57-9010 (MOLEX Part, Uses crimp terminal series 70058, 71851, 70021); Connector Height: 320 mil; Mounting Type: Through Hole; PackageDescription: Pin header; 2.54mm pitch; Pins: 10; Supplier 1: Digi-Key; Supplier 2: Newark; Supplier 3: Mouser; Supplier Part Number 1: A32700-40-ND; Supplier Part Number 2: 16M3463; Supplier Part Number 3: 571-9-146285-0
footprint PINSTRIP-SINGLE-10PIN-.1 (2.54mm (0.100") Pitch, Through Hole, Single Row, Vertical, 10 pin)
3D model Pinstrip-100mil-SINGLE_HDR-10pin (PCB3D Model)
pins: 1, 2, 3, 4, 5, 6, 7, 8, 9, 10
text: HEADER; PINSTRIP
